# Altium footprint library NXP_60_26022015.PCBLIB: 287 footprints (part 1 of 18)
Each footprint in its own frame and in the unit in brackets; x right, y up, seen from the top. Pads: shape width x height; smd on the part's side, far side on the other; paste and mask are expansions set on the pad; w line width, h text height; cw(c..) or ccw(c..) is an arc to the next point about the centre after c.
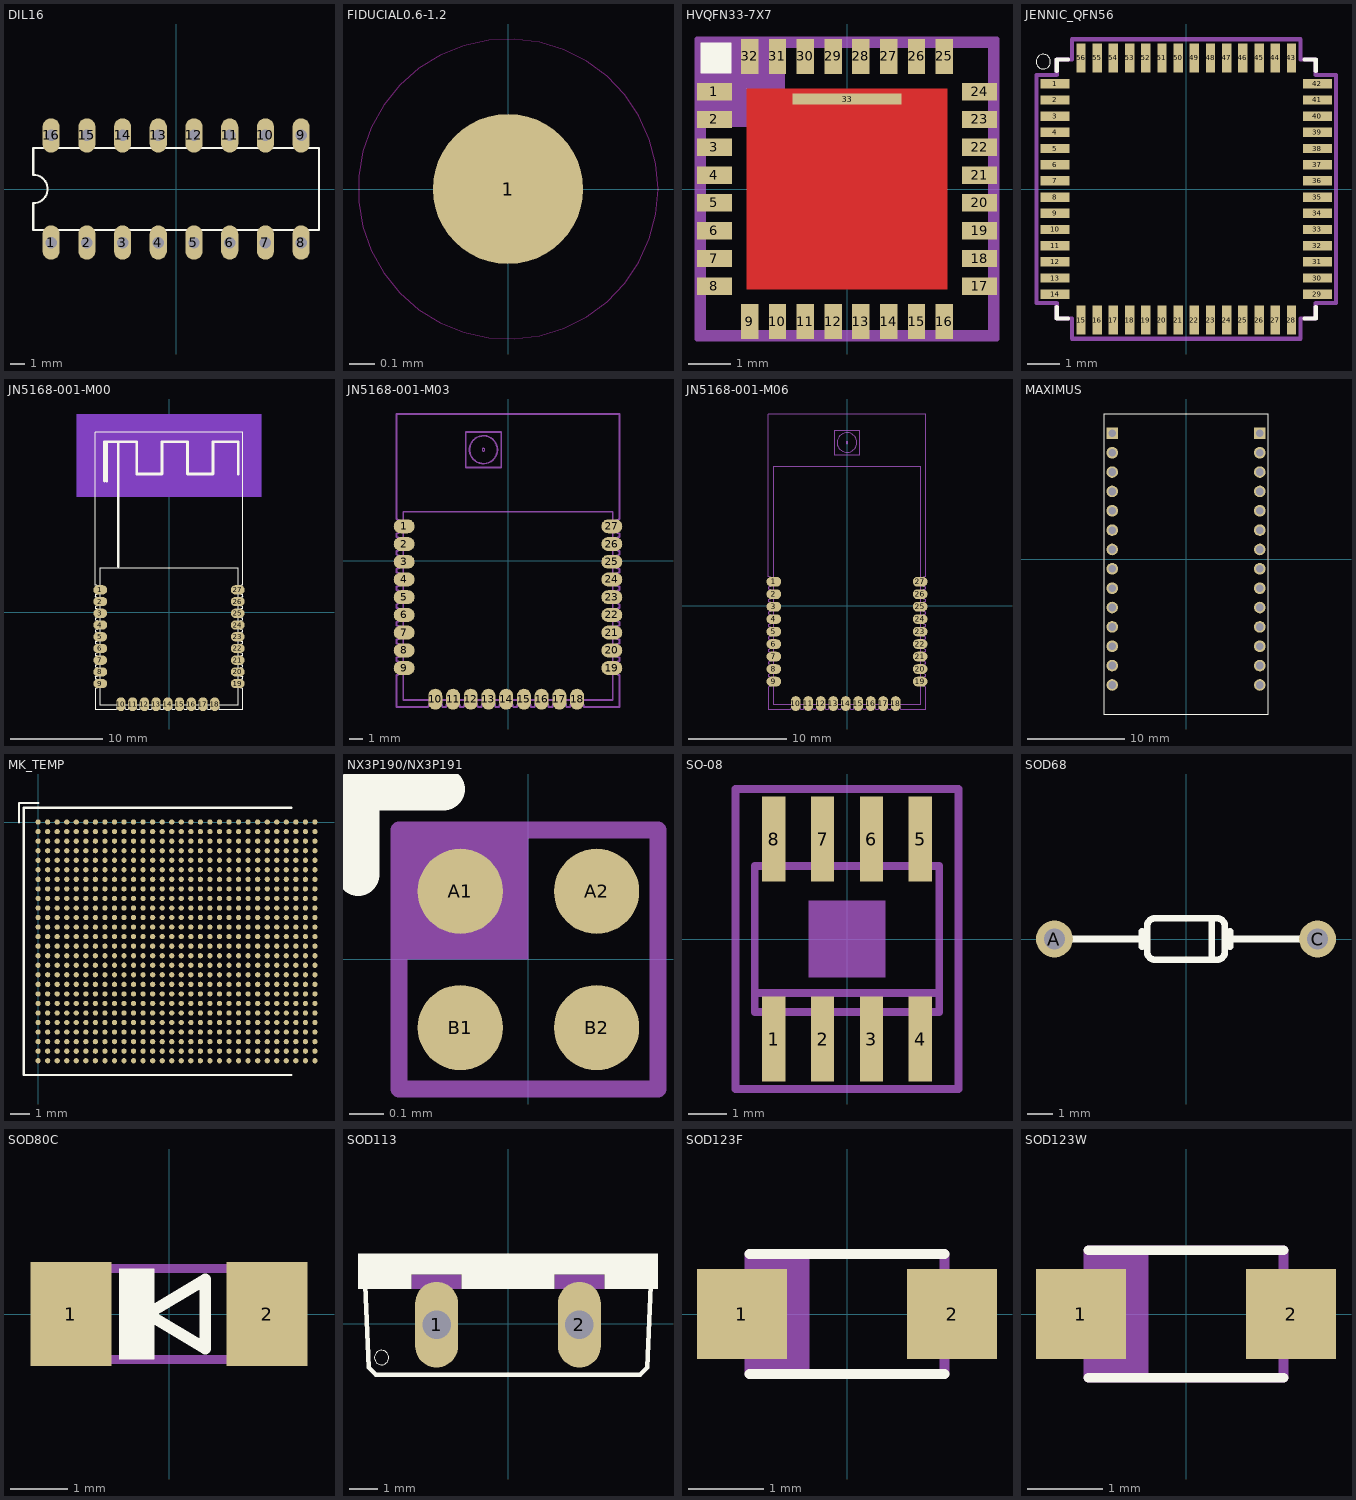
[diagram p0: the footprints below, top view; thin cyan lines are the x and y axes]

## DIL16 [mil]
pads (16):
  oval 48x96 hole 32: 1(-350,-150) 2(-250,-150) 3(-150,-150) 4(-50,-150) 5(50,-150) 6(150,-150) 7(250,-150) 8(350,-150) 9(350,150) 10(250,150) 11(150,150) 12(50,150) 13(-50,150) 14(-150,150) 15(-250,150) 16(-350,150)
Top Overlay:
  lines w6: -400,-115 400,-115 400,115 -400,115 -400,40 cw(c-400,0) -400,-40 -400,-115

## FIDUCIAL0.6-1.2 [mm]
pads (1):
  rrect100% 0.6x0.6 smd: 1(0,0)
Top Layer keep-out:
  circle w0: c0,0 r0.6
Top Solder:
  circle w0: c0,0 r0.6

## HVQFN33-7X7 [mil]
pads (33):
  rect 32x16 smd: 1(-122.05,89.57) 2(-122.05,63.98) 3(-122.05,38.39) 4(-122.05,12.8) 5(-122.05,-12.8) 6(-122.05,-38.39) 7(-122.05,-63.98) 8(-122.05,-89.57) 17(122.05,-89.57) 18(122.05,-63.98) 19(122.05,-38.39) 20(122.05,-12.8) 21(122.05,12.8) 22(122.05,38.39) 23(122.05,63.98) 24(122.05,89.57)
  rect 16x32 smd: 9(-89.57,-122.05) 10(-63.98,-122.05) 11(-38.39,-122.05) 12(-12.8,-122.05) 13(12.8,-122.05) 14(38.39,-122.05) 15(63.98,-122.05) 16(89.57,-122.05) 25(89.57,122.05) 26(63.98,122.05) 27(38.39,122.05) 28(12.8,122.05) 29(-12.8,122.05) 30(-38.39,122.05) 31(-63.98,122.05) 32(-89.57,122.05)
  rect 100x10 smd: 33(0,82.68)
Top Layer:
  rectangle: -92.52,-92.52 92.52,92.52
Top Overlay:
  rectangle: -135.04,106.3 -106.3,135.04
Top Paste:
  rectangle: -92.52,-92.52 92.52,92.52
Top Solder:
  rectangle: -92.52,-92.52 92.52,92.52
Mechanical 16:
  rectangle: -135.83,57.09 -57.09,135.83
  region: -118.11,83.66 -118.11,95.47 -137.8,95.47 -137.8,83.66
  region: -118.11,58.07 -118.11,69.88 -137.8,69.88 -137.8,58.07
  region: -118.11,32.48 -118.11,44.29 -137.8,44.29 -137.8,32.48
  region: -118.11,6.89 -118.11,18.7 -137.8,18.7 -137.8,6.89
  region: -118.11,-18.7 -118.11,-6.89 -137.8,-6.89 -137.8,-18.7
  region: -118.11,-44.29 -118.11,-32.48 -137.8,-32.48 -137.8,-44.29
  region: -118.11,-69.88 -118.11,-58.07 -137.8,-58.07 -137.8,-69.88
  region: -118.11,-95.47 -118.11,-83.66 -137.8,-83.66 -137.8,-95.47
  region: -83.66,-118.11 -95.47,-118.11 -95.47,-137.8 -83.66,-137.8
  region: -58.07,-118.11 -69.88,-118.11 -69.88,-137.8 -58.07,-137.8
  region: -32.48,-118.11 -44.29,-118.11 -44.29,-137.8 -32.48,-137.8
  region: -6.89,-118.11 -18.7,-118.11 -18.7,-137.8 -6.89,-137.8
  region: 18.7,-118.11 6.89,-118.11 6.89,-137.8 18.7,-137.8
  region: 44.29,-118.11 32.48,-118.11 32.48,-137.8 44.29,-137.8
  region: 69.88,-118.11 58.07,-118.11 58.07,-137.8 69.88,-137.8
  region: 95.47,-118.11 83.66,-118.11 83.66,-137.8 95.47,-137.8
  region: 118.11,-83.66 118.11,-95.47 137.8,-95.47 137.8,-83.66
  region: 118.11,-58.07 118.11,-69.88 137.8,-69.88 137.8,-58.07
  region: 118.11,-32.48 118.11,-44.29 137.8,-44.29 137.8,-32.48
  region: 118.11,-6.89 118.11,-18.7 137.8,-18.7 137.8,-6.89
  region: 118.11,18.7 118.11,6.89 137.8,6.89 137.8,18.7
  region: 118.11,44.29 118.11,32.48 137.8,32.48 137.8,44.29
  region: 118.11,69.88 118.11,58.07 137.8,58.07 137.8,69.88
  region: 118.11,95.47 118.11,83.66 137.8,83.66 137.8,95.47
  rectangle: 83.66,118.11 95.47,137.8
  rectangle: 58.07,118.11 69.88,137.8
  rectangle: 32.48,118.11 44.29,137.8
  rectangle: 6.89,118.11 18.7,137.8
  rectangle: -18.7,118.11 -6.89,137.8
  rectangle: -44.29,118.11 -32.48,137.8
  rectangle: -69.88,118.11 -58.07,137.8
  rectangle: -95.47,118.11 -83.66,137.8
  lines w5.91: -119.29,-92.72 ccw(c-119.29,-89.67) -119.29,-86.61 ; -119.29,-67.13 ccw(c-119.29,-64.08) -119.29,-61.02 ; -119.29,-41.54 ccw(c-119.29,-38.48) -119.29,-35.43 ; -119.29,-15.94 ccw(c-119.29,-12.89) -119.29,-9.84 ; -119.29,9.65 ccw(c-119.29,12.7) -119.29,15.75 ; -119.29,35.24 ccw(c-119.29,38.29) -119.29,41.34 ; -119.29,60.83 ccw(c-119.29,63.88) -119.29,66.93 ; -119.29,86.42 ccw(c-119.29,89.47) -119.29,92.52 ; -92.72,119.29 ccw(c-89.67,119.29) -86.61,119.29 ; -92.52,-119.29 cw(c-89.47,-119.29) -86.42,-119.29 ; -67.13,119.29 ccw(c-64.08,119.29) -61.02,119.29 ; -66.93,-119.29 cw(c-63.88,-119.29) -60.83,-119.29 ; -41.54,119.29 ccw(c-38.48,119.29) -35.43,119.29 ; -41.34,-119.29 cw(c-38.29,-119.29) -35.24,-119.29 ; -15.94,119.29 ccw(c-12.89,119.29) -9.84,119.29 ; -15.75,-119.29 cw(c-12.7,-119.29) -9.65,-119.29 ; 9.65,119.29 ccw(c12.7,119.29) 15.75,119.29 ; 9.84,-119.29 cw(c12.89,-119.29) 15.94,-119.29 ; 35.24,119.29 ccw(c38.29,119.29) 41.34,119.29 ; 35.43,-119.29 cw(c38.48,-119.29) 41.54,-119.29 ; 60.83,119.29 ccw(c63.88,119.29) 66.93,119.29 ; 61.02,-119.29 cw(c64.08,-119.29) 67.13,-119.29 ; 86.42,119.29 ccw(c89.47,119.29) 92.52,119.29 ; 86.61,-119.29 cw(c89.67,-119.29) 92.72,-119.29 ; 119.29,-92.52 cw(c119.29,-89.47) 119.29,-86.42 ; 119.29,-66.93 cw(c119.29,-63.88) 119.29,-60.83 ; 119.29,-41.34 cw(c119.29,-38.29) 119.29,-35.24 ; 119.29,-15.75 cw(c119.29,-12.7) 119.29,-9.65 ; 119.29,9.84 cw(c119.29,12.89) 119.29,15.94 ; 119.29,35.43 cw(c119.29,38.48) 119.29,41.54 ; 119.29,61.02 cw(c119.29,64.08) 119.29,67.13 ; 119.29,86.61 cw(c119.29,89.67) 119.29,92.72
  lines w8: -133.86,-133.86 133.86,-133.86 133.86,133.86 -133.86,133.86 -133.86,-133.86
Mechanical 27:
  lines w5: -137.8,-137.8 -137.8,137.8 137.8,137.8 137.8,-137.8 -137.8,-137.8

## JENNIC_QFN56 [mm]
pads (56):
  rect 0.9x0.29 smd: 1(-4.05,3.25) 2(-4.05,2.75) 3(-4.05,2.25) 4(-4.05,1.75) 5(-4.05,1.25) 6(-4.05,0.75) 7(-4.05,0.25) 8(-4.05,-0.25) 9(-4.05,-0.75) 10(-4.05,-1.25) 11(-4.05,-1.75) 12(-4.05,-2.25) 13(-4.05,-2.75) 14(-4.05,-3.25) 29(4.05,-3.25) 30(4.05,-2.75) 31(4.05,-2.25) 32(4.05,-1.75) 33(4.05,-1.25) 34(4.05,-0.75) 35(4.05,-0.25) 36(4.05,0.25) 37(4.05,0.75) 38(4.05,1.25) 39(4.05,1.75) 40(4.05,2.25) 41(4.05,2.75) 42(4.05,3.25)
  rect 0.29x0.9 smd: 15(-3.25,-4.05) 16(-2.75,-4.05) 17(-2.25,-4.05) 18(-1.75,-4.05) 19(-1.25,-4.05) 20(-0.75,-4.05) 21(-0.25,-4.05) 22(0.25,-4.05) 23(0.75,-4.05) 24(1.25,-4.05) 25(1.75,-4.05) 26(2.25,-4.05) 27(2.75,-4.05) 28(3.25,-4.05) 43(3.25,4.05) 44(2.75,4.05) 45(2.25,4.05) 46(1.75,4.05) 47(1.25,4.05) 48(0.75,4.05) 49(0.25,4.05) 50(-0.25,4.05) 51(-0.75,4.05) 52(-1.25,4.05) 53(-1.75,4.05) 54(-2.25,4.05) 55(-2.75,4.05) 56(-3.25,4.05)
Top Overlay:
  circle w0: c-4.418,3.935 r0.224
  lines w0.127: -4,-3.65 -4,-4 -3.65,-4 ; -4,3.65 -4,4 -3.65,4 ; 3.65,-4 4,-4 4,-3.65 ; 3.65,4 4,4 4,3.65
Mechanical 16:
  lines w0.127: -4.625,-3.525 -4.625,3.525 -4,3.525 -4,4 -3.525,4 -3.525,4.625 3.525,4.625 3.525,4 4,4 4,3.525 4.625,3.525 4.625,-3.525 4,-3.525 4,-4 3.525,-4 3.525,-4.625 -3.525,-4.625 -3.525,-4 -4,-4 -4,-3.525 -4.625,-3.525

## JN5168-001-M00 [mm]
pads (27):
  rrect100% 1.5x1 smd: 1(-7.44,2.45) 2(-7.44,1.18) 3(-7.44,-0.09) 4(-7.44,-1.36) 5(-7.44,-2.63) 6(-7.44,-3.9) 7(-7.44,-5.17) 8(-7.44,-6.44) 9(-7.44,-7.71) 19(7.44,-7.71) 20(7.44,-6.44) 21(7.44,-5.17) 22(7.44,-3.9) 23(7.44,-2.63) 24(7.44,-1.36) 25(7.44,-0.09) 26(7.44,1.18) 27(7.44,2.45)
  rrect100% 1x1.5 smd: 10(-5.21,-9.94) 11(-3.94,-9.94) 12(-2.67,-9.94) 13(-1.4,-9.94) 14(-0.13,-9.94) 15(1.14,-9.94) 16(2.41,-9.94) 17(3.68,-9.94) 18(4.95,-9.94)
Top Layer keep-out:
  rectangle: -10,12.5 10,21.5
Bottom Layer keep-out:
  rectangle: -10,12.5 10,21.5
Top Overlay:
  lines w0.127: -8,-10.5 -8,-8.21 ccw(c-8,-7.71) -8,-7.21 -8,-6.94 ccw(c-8,-6.44) -8,-5.94 -8,-5.67 ccw(c-8,-5.17) -8,-4.67 -8,-4.4 ccw(c-8,-3.9) -8,-3.4 -8,-3.13 ccw(c-8,-2.63) -8,-2.13 -8,-1.86 ccw(c-8,-1.36) -8,-0.86 -8,-0.59 ccw(c-8,-0.09) -8,0.41 -8,0.68 ccw(c-8,1.18) -8,1.68 -8,1.95 ccw(c-8,2.45) -8,2.95 -8,19.5 8,19.5 8,2.95 ccw(c8,2.45) 8,1.95 8,1.68 ccw(c8,1.18) 8,0.68 8,0.41 ccw(c8,-0.09) 8,-0.59 8,-0.86 ccw(c8,-1.36) 8,-1.86 8,-2.13 ccw(c8,-2.63) 8,-3.13 8,-3.4 ccw(c8,-3.9) 8,-4.4 8,-4.67 ccw(c8,-5.17) 8,-5.67 8,-5.94 ccw(c8,-6.44) 8,-6.94 8,-7.21 ccw(c8,-7.71) 8,-8.21 8,-10.5 5.45,-10.5 ccw(c4.95,-10.5) 4.45,-10.5 4.18,-10.5 ccw(c3.68,-10.5) 3.18,-10.5 2.91,-10.5 ccw(c2.41,-10.5) 1.91,-10.5 1.64,-10.5 ccw(c1.14,-10.5) 0.64,-10.5 0.37,-10.5 ccw(c-0.13,-10.5) -0.63,-10.5 -0.9,-10.5 ccw(c-1.4,-10.5) -1.9,-10.5 -2.17,-10.5 ccw(c-2.67,-10.5) -3.17,-10.5 -3.44,-10.5 ccw(c-3.94,-10.5) -4.44,-10.5 -4.71,-10.5 ccw(c-5.21,-10.5) -5.71,-10.5 -8,-10.5 ; -7.5,-10 -7.5,4.77 7.5,4.77 7.5,-10 -7.5,-10
  lines w0.305: -6.75,14.25 -6.75,18.5 ; -5.5,5 -5.5,18.5 ; 7.5,15 7.5,18.5 4.75,18.5 4.75,15 2,15 2,18.5 -0.75,18.5 -0.75,15 -3.5,15 -3.5,18.5 -5.5,18.5 ; -7,18.5 -6.75,18.5 ; -7,18.5 -7,14.25 -7,18.5 ; -6.75,18.5 -5.5,18.5

## JN5168-001-M03 [mm]
pads (27):
  rrect100% 1.5x1 smd: 1(-7.44,2.45) 2(-7.44,1.18) 3(-7.44,-0.09) 4(-7.44,-1.36) 5(-7.44,-2.63) 6(-7.44,-3.9) 7(-7.44,-5.17) 8(-7.44,-6.44) 9(-7.44,-7.71) 19(7.44,-7.71) 20(7.44,-6.44) 21(7.44,-5.17) 22(7.44,-3.9) 23(7.44,-2.63) 24(7.44,-1.36) 25(7.44,-0.09) 26(7.44,1.18) 27(7.44,2.45)
  rrect100% 1x1.5 smd: 10(-5.21,-9.94) 11(-3.94,-9.94) 12(-2.67,-9.94) 13(-1.4,-9.94) 14(-0.13,-9.94) 15(1.14,-9.94) 16(2.41,-9.94) 17(3.68,-9.94) 18(4.95,-9.94)
Mechanical 16:
  circle w0.127: c-1.76,7.94 r1
  circle w0: c-1.76,7.94 r0.1
  lines w0.127: -8,-10.5 -8,-8.21 ccw(c-8,-7.71) -8,-7.21 -8,-6.94 ccw(c-8,-6.44) -8,-5.94 -8,-5.67 ccw(c-8,-5.17) -8,-4.67 -8,-4.4 ccw(c-8,-3.9) -8,-3.4 -8,-3.13 ccw(c-8,-2.63) -8,-2.13 -8,-1.86 ccw(c-8,-1.36) -8,-0.86 -8,-0.59 ccw(c-8,-0.09) -8,0.41 -8,0.68 ccw(c-8,1.18) -8,1.68 -8,1.95 ccw(c-8,2.45) -8,2.95 -8,10.5 8,10.5 8,2.95 ccw(c8,2.45) 8,1.95 8,1.68 ccw(c8,1.18) 8,0.68 8,0.41 ccw(c8,-0.09) 8,-0.59 8,-0.86 ccw(c8,-1.36) 8,-1.86 8,-2.13 ccw(c8,-2.63) 8,-3.13 8,-3.4 ccw(c8,-3.9) 8,-4.4 8,-4.67 ccw(c8,-5.17) 8,-5.67 8,-5.94 ccw(c8,-6.44) 8,-6.94 8,-7.21 ccw(c8,-7.71) 8,-8.21 8,-10.5 5.45,-10.5 ccw(c4.95,-10.5) 4.45,-10.5 4.18,-10.5 ccw(c3.68,-10.5) 3.18,-10.5 2.91,-10.5 ccw(c2.41,-10.5) 1.91,-10.5 1.64,-10.5 ccw(c1.14,-10.5) 0.64,-10.5 0.37,-10.5 ccw(c-0.13,-10.5) -0.63,-10.5 -0.9,-10.5 ccw(c-1.4,-10.5) -1.9,-10.5 -2.17,-10.5 ccw(c-2.67,-10.5) -3.17,-10.5 -3.44,-10.5 ccw(c-3.94,-10.5) -4.44,-10.5 -4.71,-10.5 ccw(c-5.21,-10.5) -5.71,-10.5 -8,-10.5 ; -7.5,-10 -7.5,3.5 7.5,3.5 7.5,-10 -7.5,-10 ; -3.03,6.67 -0.49,6.67 -0.49,9.21 -3.03,9.21 -3.03,6.67

## JN5168-001-M06 [mm]
pads (27):
  rrect100% 1.5x1 smd: 1(-7.44,2.45) 2(-7.44,1.18) 3(-7.44,-0.09) 4(-7.44,-1.36) 5(-7.44,-2.63) 6(-7.44,-3.9) 7(-7.44,-5.17) 8(-7.44,-6.44) 9(-7.44,-7.71) 19(7.44,-7.71) 20(7.44,-6.44) 21(7.44,-5.17) 22(7.44,-3.9) 23(7.44,-2.63) 24(7.44,-1.36) 25(7.44,-0.09) 26(7.44,1.18) 27(7.44,2.45)
  rrect100% 1x1.5 smd: 10(-5.21,-9.94) 11(-3.94,-9.94) 12(-2.67,-9.94) 13(-1.4,-9.94) 14(-0.13,-9.94) 15(1.14,-9.94) 16(2.41,-9.94) 17(3.68,-9.94) 18(4.95,-9.94)
Mechanical 16:
  circle w0.127: c0,16.6 r1
  circle w0: c0,16.6 r0.1
  lines w0.127: -8,-10.5 -8,-8.21 ccw(c-8,-7.71) -8,-7.21 -8,-6.94 ccw(c-8,-6.44) -8,-5.94 -8,-5.67 ccw(c-8,-5.17) -8,-4.67 -8,-4.4 ccw(c-8,-3.9) -8,-3.4 -8,-3.13 ccw(c-8,-2.63) -8,-2.13 -8,-1.86 ccw(c-8,-1.36) -8,-0.86 -8,-0.59 ccw(c-8,-0.09) -8,0.41 -8,0.68 ccw(c-8,1.18) -8,1.68 -8,1.95 ccw(c-8,2.45) -8,2.95 -8,19.5 8,19.5 8,2.95 ccw(c8,2.45) 8,1.95 8,1.68 ccw(c8,1.18) 8,0.68 8,0.41 ccw(c8,-0.09) 8,-0.59 8,-0.86 ccw(c8,-1.36) 8,-1.86 8,-2.13 ccw(c8,-2.63) 8,-3.13 8,-3.4 ccw(c8,-3.9) 8,-4.4 8,-4.67 ccw(c8,-5.17) 8,-5.67 8,-5.94 ccw(c8,-6.44) 8,-6.94 8,-7.21 ccw(c8,-7.71) 8,-8.21 8,-10.5 5.45,-10.5 ccw(c4.95,-10.5) 4.45,-10.5 4.18,-10.5 ccw(c3.68,-10.5) 3.18,-10.5 2.91,-10.5 ccw(c2.41,-10.5) 1.91,-10.5 1.64,-10.5 ccw(c1.14,-10.5) 0.64,-10.5 0.37,-10.5 ccw(c-0.13,-10.5) -0.63,-10.5 -0.9,-10.5 ccw(c-1.4,-10.5) -1.9,-10.5 -2.17,-10.5 ccw(c-2.67,-10.5) -3.17,-10.5 -3.44,-10.5 ccw(c-3.94,-10.5) -4.44,-10.5 -4.71,-10.5 ccw(c-5.21,-10.5) -5.71,-10.5 -8,-10.5 ; -7.5,-10 -7.5,14.16 7.5,14.16 7.5,-10 -7.5,-10 ; -1.27,15.33 1.27,15.33 1.27,17.87 -1.27,17.87 -1.27,15.33

## MAXIMUS [mil]
pads (28):
  rect 47.25x47.25 hole 31.5: X1_1(-300.2,511.81) X2_1(300.2,511.81)
  round 47.25 hole 31.5: X1_2(-300.2,433.07) X1_3(-300.2,354.33) X1_4(-300.2,275.59) X1_5(-300.2,196.85) X1_6(-300.2,118.11) X1_7(-300.2,39.37) X1_8(-300.2,-39.37) X1_9(-300.2,-118.11) X1_10(-300.2,-196.85) X1_11(-300.2,-275.59) X1_12(-300.2,-354.33) X1_13(-300.2,-433.07) X1_14(-300.2,-511.81) X2_2(300.2,433.07) X2_3(300.2,354.33) X2_4(300.2,275.59) X2_5(300.2,196.85) X2_6(300.2,118.11) X2_7(300.2,39.37) X2_8(300.2,-39.37) X2_9(300.2,-118.11) X2_10(300.2,-196.85) X2_11(300.2,-275.59) X2_12(300.2,-354.33) X2_13(300.2,-433.07) X2_14(300.2,-511.81)
Top Overlay:
  lines w5: -334.65,-629.92 -334.65,590.55 334.65,590.55 334.65,-629.92 -334.65,-629.92

## MK_TEMP [mm]
pads (780):
  rrect100% 0.275x0.275 smd: A1(0,0) A2(0.5,0) A3(1,0) A4(1.5,0) A5(2,0) A6(2.5,0) A7(3,0) A8(3.5,0) A9(4,0) A10(4.5,0) A11(5,0) A12(5.5,0) A13(6,0) A14(6.5,0) A15(7,0) A16(7.5,0) A17(8,0) A18(8.5,0) A19(9,0) A20(9.5,0) A21(10,0) A22(10.5,0) A23(11,0) A24(11.5,0) A25(12,0) A26(12.5,0) A27(13,0) A28(13.5,0) A29(14,0) A30(14.5,0) AA1(0,-10) AA2(0.5,-10) AA3(1,-10) AA4(1.5,-10) AA5(2,-10) AA6(2.5,-10) AA7(3,-10) AA8(3.5,-10) AA9(4,-10) AA10(4.5,-10) AA11(5,-10) AA12(5.5,-10) AA13(6,-10) AA14(6.5,-10) AA15(7,-10) AA16(7.5,-10) AA17(8,-10) AA18(8.5,-10) AA19(9,-10) AA20(9.5,-10) AA21(10,-10) AA22(10.5,-10) AA23(11,-10) AA24(11.5,-10) AA25(12,-10) AA26(12.5,-10) AA27(13,-10) AA28(13.5,-10) AA29(14,-10) AA30(14.5,-10) AB1(0,-10.5) AB2(0.5,-10.5) AB3(1,-10.5) AB4(1.5,-10.5) AB5(2,-10.5) AB6(2.5,-10.5) AB7(3,-10.5) AB8(3.5,-10.5) AB9(4,-10.5) AB10(4.5,-10.5) AB11(5,-10.5) AB12(5.5,-10.5) AB13(6,-10.5) AB14(6.5,-10.5) AB15(7,-10.5) AB16(7.5,-10.5) AB17(8,-10.5) AB18(8.5,-10.5) AB19(9,-10.5) AB20(9.5,-10.5) AB21(10,-10.5) AB22(10.5,-10.5) AB23(11,-10.5) AB24(11.5,-10.5) AB25(12,-10.5) AB26(12.5,-10.5) AB27(13,-10.5) AB28(13.5,-10.5) AB29(14,-10.5) AB30(14.5,-10.5) AC1(0,-11) AC2(0.5,-11) AC3(1,-11) AC4(1.5,-11) AC5(2,-11) AC6(2.5,-11) AC7(3,-11) AC8(3.5,-11) AC9(4,-11) AC10(4.5,-11) AC11(5,-11) AC12(5.5,-11) AC13(6,-11) AC14(6.5,-11) AC15(7,-11) AC16(7.5,-11) AC17(8,-11) AC18(8.5,-11) AC19(9,-11) AC20(9.5,-11) AC21(10,-11) AC22(10.5,-11) AC23(11,-11) AC24(11.5,-11) AC25(12,-11) AC26(12.5,-11) AC27(13,-11) AC28(13.5,-11) AC29(14,-11) AC30(14.5,-11) AD1(0,-11.5) AD2(0.5,-11.5) AD3(1,-11.5) AD4(1.5,-11.5) AD5(2,-11.5) AD6(2.5,-11.5) AD7(3,-11.5) AD8(3.5,-11.5) AD9(4,-11.5) AD10(4.5,-11.5) AD11(5,-11.5) AD12(5.5,-11.5) AD13(6,-11.5) AD14(6.5,-11.5) AD15(7,-11.5) AD16(7.5,-11.5) AD17(8,-11.5) AD18(8.5,-11.5) AD19(9,-11.5) AD20(9.5,-11.5) AD21(10,-11.5) AD22(10.5,-11.5) AD23(11,-11.5) AD24(11.5,-11.5) AD25(12,-11.5) AD26(12.5,-11.5) AD27(13,-11.5) AD28(13.5,-11.5) AD29(14,-11.5) AD30(14.5,-11.5) AE1(0,-12) AE2(0.5,-12) AE3(1,-12) AE4(1.5,-12) AE5(2,-12) AE6(2.5,-12) AE7(3,-12) AE8(3.5,-12) AE9(4,-12) AE10(4.5,-12) AE11(5,-12) AE12(5.5,-12) AE13(6,-12) AE14(6.5,-12) AE15(7,-12) AE16(7.5,-12) AE17(8,-12) AE18(8.5,-12) AE19(9,-12) AE20(9.5,-12) AE21(10,-12) AE22(10.5,-12) AE23(11,-12) AE24(11.5,-12) AE25(12,-12) AE26(12.5,-12) AE27(13,-12) AE28(13.5,-12) AE29(14,-12) AE30(14.5,-12) AF1(0,-12.5) AF2(0.5,-12.5) AF3(1,-12.5) AF4(1.5,-12.5) AF5(2,-12.5) AF6(2.5,-12.5) AF7(3,-12.5) AF8(3.5,-12.5) AF9(4,-12.5) AF10(4.5,-12.5) AF11(5,-12.5) AF12(5.5,-12.5) AF13(6,-12.5) AF14(6.5,-12.5) AF15(7,-12.5) AF16(7.5,-12.5) AF17(8,-12.5) AF18(8.5,-12.5) AF19(9,-12.5) AF20(9.5,-12.5) AF21(10,-12.5) AF22(10.5,-12.5) AF23(11,-12.5) AF24(11.5,-12.5) AF25(12,-12.5) AF26(12.5,-12.5) AF27(13,-12.5) AF28(13.5,-12.5) AF29(14,-12.5) AF30(14.5,-12.5) B1(0,-0.5) B2(0.5,-0.5) B3(1,-0.5) B4(1.5,-0.5) B5(2,-0.5) B6(2.5,-0.5) B7(3,-0.5) B8(3.5,-0.5) B9(4,-0.5) B10(4.5,-0.5) B11(5,-0.5) B12(5.5,-0.5) B13(6,-0.5) B14(6.5,-0.5) B15(7,-0.5) B16(7.5,-0.5) B17(8,-0.5) B18(8.5,-0.5) B19(9,-0.5) B20(9.5,-0.5) B21(10,-0.5) B22(10.5,-0.5) B23(11,-0.5) B24(11.5,-0.5) B25(12,-0.5) B26(12.5,-0.5) B27(13,-0.5) B28(13.5,-0.5) B29(14,-0.5) B30(14.5,-0.5) C1(0,-1) C2(0.5,-1) C3(1,-1) C4(1.5,-1) C5(2,-1) C6(2.5,-1) C7(3,-1) C8(3.5,-1) C9(4,-1) C10(4.5,-1) C11(5,-1) C12(5.5,-1) C13(6,-1) C14(6.5,-1) C15(7,-1) C16(7.5,-1) C17(8,-1) C18(8.5,-1) C19(9,-1) C20(9.5,-1) C21(10,-1) C22(10.5,-1) C23(11,-1) C24(11.5,-1) C25(12,-1) C26(12.5,-1) C27(13,-1) C28(13.5,-1) C29(14,-1) C30(14.5,-1) D1(0,-1.5) D2(0.5,-1.5) D3(1,-1.5) D4(1.5,-1.5) D5(2,-1.5) D6(2.5,-1.5) D7(3,-1.5) D8(3.5,-1.5) D9(4,-1.5) D10(4.5,-1.5) D11(5,-1.5) D12(5.5,-1.5) D13(6,-1.5) D14(6.5,-1.5) D15(7,-1.5) D16(7.5,-1.5) D17(8,-1.5) D18(8.5,-1.5) D19(9,-1.5) D20(9.5,-1.5) D21(10,-1.5) D22(10.5,-1.5) D23(11,-1.5) D24(11.5,-1.5) D25(12,-1.5) D26(12.5,-1.5) D27(13,-1.5) D28(13.5,-1.5) D29(14,-1.5) D30(14.5,-1.5) E1(0,-2) E2(0.5,-2) E3(1,-2) E4(1.5,-2) E5(2,-2) E6(2.5,-2) E7(3,-2) E8(3.5,-2) E9(4,-2) E10(4.5,-2) E11(5,-2) E12(5.5,-2) E13(6,-2) E14(6.5,-2) E15(7,-2) E16(7.5,-2) E17(8,-2) E18(8.5,-2) E19(9,-2) E20(9.5,-2) E21(10,-2) E22(10.5,-2) E23(11,-2) E24(11.5,-2) E25(12,-2) E26(12.5,-2) E27(13,-2) E28(13.5,-2) E29(14,-2) E30(14.5,-2) F1(0,-2.5) F2(0.5,-2.5) F3(1,-2.5) F4(1.5,-2.5) F5(2,-2.5) F6(2.5,-2.5) F7(3,-2.5) F8(3.5,-2.5) F9(4,-2.5) F10(4.5,-2.5) F11(5,-2.5) F12(5.5,-2.5) F13(6,-2.5) F14(6.5,-2.5) F15(7,-2.5) F16(7.5,-2.5) F17(8,-2.5) F18(8.5,-2.5) F19(9,-2.5) F20(9.5,-2.5) F21(10,-2.5) F22(10.5,-2.5) F23(11,-2.5) F24(11.5,-2.5) F25(12,-2.5) F26(12.5,-2.5) F27(13,-2.5) F28(13.5,-2.5) F29(14,-2.5) F30(14.5,-2.5) G1(0,-3) G2(0.5,-3) G3(1,-3) G4(1.5,-3) G5(2,-3) G6(2.5,-3) G7(3,-3) G8(3.5,-3) G9(4,-3) G10(4.5,-3) G11(5,-3) G12(5.5,-3) G13(6,-3) G14(6.5,-3) G15(7,-3) G16(7.5,-3) G17(8,-3) G18(8.5,-3) G19(9,-3) G20(9.5,-3) G21(10,-3) G22(10.5,-3) G23(11,-3) G24(11.5,-3) G25(12,-3) G26(12.5,-3) G27(13,-3) G28(13.5,-3) G29(14,-3) G30(14.5,-3) H1(0,-3.5) H2(0.5,-3.5) H3(1,-3.5) H4(1.5,-3.5) H5(2,-3.5) H6(2.5,-3.5) H7(3,-3.5) H8(3.5,-3.5) H9(4,-3.5) H10(4.5,-3.5) H11(5,-3.5) H12(5.5,-3.5) H13(6,-3.5) H14(6.5,-3.5) H15(7,-3.5) H16(7.5,-3.5) H17(8,-3.5) H18(8.5,-3.5) H19(9,-3.5) H20(9.5,-3.5) H21(10,-3.5) H22(10.5,-3.5) H23(11,-3.5) H24(11.5,-3.5) H25(12,-3.5) H26(12.5,-3.5) H27(13,-3.5) H28(13.5,-3.5) H29(14,-3.5) H30(14.5,-3.5) J1(0,-4) J2(0.5,-4) J3(1,-4) J4(1.5,-4) J5(2,-4) J6(2.5,-4) J7(3,-4) J8(3.5,-4) J9(4,-4) J10(4.5,-4) J11(5,-4) J12(5.5,-4) J13(6,-4) J14(6.5,-4) J15(7,-4) J16(7.5,-4) J17(8,-4) J18(8.5,-4) J19(9,-4) J20(9.5,-4) J21(10,-4) J22(10.5,-4) J23(11,-4) J24(11.5,-4) J25(12,-4) J26(12.5,-4) J27(13,-4) J28(13.5,-4) J29(14,-4) J30(14.5,-4) K1(0,-4.5) K2(0.5,-4.5) K3(1,-4.5) K4(1.5,-4.5) K5(2,-4.5) K6(2.5,-4.5) K7(3,-4.5) K8(3.5,-4.5) K9(4,-4.5) K10(4.5,-4.5) K11(5,-4.5) K12(5.5,-4.5) K13(6,-4.5) K14(6.5,-4.5) K15(7,-4.5) K16(7.5,-4.5) K17(8,-4.5) K18(8.5,-4.5) K19(9,-4.5) K20(9.5,-4.5) K21(10,-4.5) K22(10.5,-4.5) K23(11,-4.5) K24(11.5,-4.5) K25(12,-4.5) K26(12.5,-4.5) K27(13,-4.5) K28(13.5,-4.5) K29(14,-4.5) K30(14.5,-4.5) L1(0,-5) L2(0.5,-5) L3(1,-5) L4(1.5,-5) L5(2,-5) L6(2.5,-5) L7(3,-5) L8(3.5,-5) L9(4,-5) L10(4.5,-5) L11(5,-5) L12(5.5,-5) L13(6,-5) L14(6.5,-5) L15(7,-5) L16(7.5,-5) L17(8,-5) L18(8.5,-5) L19(9,-5) L20(9.5,-5) L21(10,-5) L22(10.5,-5) L23(11,-5) L24(11.5,-5) L25(12,-5) L26(12.5,-5) L27(13,-5) L28(13.5,-5) L29(14,-5) L30(14.5,-5) M1(0,-5.5) M2(0.5,-5.5) M3(1,-5.5) M4(1.5,-5.5) M5(2,-5.5) M6(2.5,-5.5) M7(3,-5.5) M8(3.5,-5.5) M9(4,-5.5) M10(4.5,-5.5) M11(5,-5.5) M12(5.5,-5.5) M13(6,-5.5) M14(6.5,-5.5) M15(7,-5.5) M16(7.5,-5.5) M17(8,-5.5) M18(8.5,-5.5) M19(9,-5.5) M20(9.5,-5.5) M21(10,-5.5) M22(10.5,-5.5) M23(11,-5.5) M24(11.5,-5.5) M25(12,-5.5) M26(12.5,-5.5) M27(13,-5.5) M28(13.5,-5.5) M29(14,-5.5) M30(14.5,-5.5) N1(0,-6) N2(0.5,-6) N3(1,-6) N4(1.5,-6) N5(2,-6) N6(2.5,-6) N7(3,-6) N8(3.5,-6) N9(4,-6) N10(4.5,-6) N11(5,-6) N12(5.5,-6) N13(6,-6) N14(6.5,-6) N15(7,-6) N16(7.5,-6) N17(8,-6) N18(8.5,-6) N19(9,-6) N20(9.5,-6) N21(10,-6) N22(10.5,-6) N23(11,-6) N24(11.5,-6) N25(12,-6) N26(12.5,-6) N27(13,-6) N28(13.5,-6) N29(14,-6) N30(14.5,-6) P1(0,-6.5) P2(0.5,-6.5) P3(1,-6.5) P4(1.5,-6.5) P5(2,-6.5) P6(2.5,-6.5) P7(3,-6.5) P8(3.5,-6.5) P9(4,-6.5) P10(4.5,-6.5) P11(5,-6.5) P12(5.5,-6.5) P13(6,-6.5) P14(6.5,-6.5) P15(7,-6.5) P16(7.5,-6.5) P17(8,-6.5) P18(8.5,-6.5) P19(9,-6.5) P20(9.5,-6.5) P21(10,-6.5) P22(10.5,-6.5) P23(11,-6.5) P24(11.5,-6.5) P25(12,-6.5) P26(12.5,-6.5) P27(13,-6.5) P28(13.5,-6.5) P29(14,-6.5) P30(14.5,-6.5) R1(0,-7) R2(0.5,-7) R3(1,-7) R4(1.5,-7) R5(2,-7) R6(2.5,-7) R7(3,-7) R8(3.5,-7) R9(4,-7) R10(4.5,-7) R11(5,-7) R12(5.5,-7) R13(6,-7) R14(6.5,-7) R15(7,-7) R16(7.5,-7) R17(8,-7) R18(8.5,-7) R19(9,-7) R20(9.5,-7) R21(10,-7) R22(10.5,-7) R23(11,-7) R24(11.5,-7) R25(12,-7) R26(12.5,-7) R27(13,-7) R28(13.5,-7) R29(14,-7) R30(14.5,-7) T1(0,-7.5) T2(0.5,-7.5) T3(1,-7.5) T4(1.5,-7.5) T5(2,-7.5) T6(2.5,-7.5) T7(3,-7.5) T8(3.5,-7.5) T9(4,-7.5) T10(4.5,-7.5) T11(5,-7.5) T12(5.5,-7.5) T13(6,-7.5) T14(6.5,-7.5) T15(7,-7.5) T16(7.5,-7.5) T17(8,-7.5) T18(8.5,-7.5) T19(9,-7.5) T20(9.5,-7.5) T21(10,-7.5) T22(10.5,-7.5) T23(11,-7.5) T24(11.5,-7.5) T25(12,-7.5) T26(12.5,-7.5) T27(13,-7.5) T28(13.5,-7.5) T29(14,-7.5) T30(14.5,-7.5) U1(0,-8) U2(0.5,-8) U3(1,-8) U4(1.5,-8) U5(2,-8) U6(2.5,-8) U7(3,-8) U8(3.5,-8) U9(4,-8) U10(4.5,-8) U11(5,-8) U12(5.5,-8) U13(6,-8) U14(6.5,-8) U15(7,-8) U16(7.5,-8) U17(8,-8) U18(8.5,-8) U19(9,-8) U20(9.5,-8) U21(10,-8) U22(10.5,-8) U23(11,-8) U24(11.5,-8) U25(12,-8) U26(12.5,-8) U27(13,-8) U28(13.5,-8) U29(14,-8) U30(14.5,-8) V1(0,-8.5) V2(0.5,-8.5) V3(1,-8.5) V4(1.5,-8.5) V5(2,-8.5) V6(2.5,-8.5) V7(3,-8.5) V8(3.5,-8.5) V9(4,-8.5) V10(4.5,-8.5) V11(5,-8.5) V12(5.5,-8.5) V13(6,-8.5) V14(6.5,-8.5) V15(7,-8.5) V16(7.5,-8.5) V17(8,-8.5) V18(8.5,-8.5) V19(9,-8.5) V20(9.5,-8.5) V21(10,-8.5) V22(10.5,-8.5) V23(11,-8.5) V24(11.5,-8.5) V25(12,-8.5) V26(12.5,-8.5) V27(13,-8.5) V28(13.5,-8.5) V29(14,-8.5) V30(14.5,-8.5) W1(0,-9) W2(0.5,-9) W3(1,-9) W4(1.5,-9) W5(2,-9) W6(2.5,-9) W7(3,-9) W8(3.5,-9) W9(4,-9) W10(4.5,-9) W11(5,-9) W12(5.5,-9) W13(6,-9) W14(6.5,-9) W15(7,-9) W16(7.5,-9) W17(8,-9) W18(8.5,-9) W19(9,-9) W20(9.5,-9) W21(10,-9) W22(10.5,-9) W23(11,-9) W24(11.5,-9) W25(12,-9) W26(12.5,-9) W27(13,-9) W28(13.5,-9) W29(14,-9) W30(14.5,-9) Y1(0,-9.5) Y2(0.5,-9.5) Y3(1,-9.5) Y4(1.5,-9.5) Y5(2,-9.5) Y6(2.5,-9.5) Y7(3,-9.5) Y8(3.5,-9.5) Y9(4,-9.5) Y10(4.5,-9.5) Y11(5,-9.5) Y12(5.5,-9.5) Y13(6,-9.5) Y14(6.5,-9.5) Y15(7,-9.5) Y16(7.5,-9.5) Y17(8,-9.5) Y18(8.5,-9.5) Y19(9,-9.5) Y20(9.5,-9.5) Y21(10,-9.5) Y22(10.5,-9.5) Y23(11,-9.5) Y24(11.5,-9.5) Y25(12,-9.5) Y26(12.5,-9.5) Y27(13,-9.5) Y28(13.5,-9.5) Y29(14,-9.5) Y30(14.5,-9.5)
Top Overlay:
  lines w0.127: -1,0 -1,1 0,1 ; 13.25,-13.25 -0.75,-13.25 -0.75,0.75 13.25,0.75
Top Paste:
  drawing of 780 lines, arcs and shapes, not listed
Top Solder:
  drawing of 780 lines, arcs and shapes, not listed

## NX3P190/NX3P191 [mm]
pads (4):
  rrect100% 0.25x0.25 smd: A1(-0.2,0.2) A2(0.2,0.2) B1(-0.2,-0.2) B2(0.2,-0.2)
Top Overlay:
  lines w0.127: -0.5,0.25 -0.5,0.5 -0.25,0.5
Top Solder:
  circle w0: c0.2,0.2 r0.163
  circle w0: c-0.2,0.2 r0.163
  circle w0: c-0.2,-0.2 r0.163
  circle w0: c0.2,-0.2 r0.163
Mechanical 16:
  rectangle: -0.38,0 0,0.38
  lines w0.05: -0.38,-0.38 0.38,-0.38 0.38,0.38 -0.38,0.38 -0.38,-0.38

## SO-08 [mm]
pads (8):
  rect 0.6x2.2 smd: 1(-1.905,-2.6) 2(-0.635,-2.6) 3(0.635,-2.6) 4(1.905,-2.6) 5(1.905,2.6) 6(0.635,2.6) 7(-0.635,2.6) 8(-1.905,2.6)
Mechanical 6:
  rectangle: -1,-1 1,1
Mechanical 13:
  text "IPC SO8" at -1.905,-0.635 h0.63
  text "JEDEC MS-012 AA" at -1.905,0.365 h0.47
Mechanical 16:
  rectangle: -2.15,-3.1 -1.66,-2
  rectangle: -0.88,-3.1 -0.39,-2
  rectangle: 0.39,-3.1 0.88,-2
  rectangle: 1.66,-3.1 2.15,-2
  rectangle: 1.66,2 2.15,3.1
  rectangle: 0.39,2 0.88,3.1
  rectangle: -0.88,2 -0.39,3.1
  rectangle: -2.15,2 -1.66,3.1
  lines w0.203: -2.4,-1.4 -2.4,-1.9 2.4,-1.9 2.4,-1.4 ; -2.4,-1.4 -2.4,1.9 2.4,1.9 2.4,-1.4 ; -2.4,-1.4 2.4,-1.4
Mechanical 27:
  lines w0.2: -2.9,-3.9 2.9,-3.9 2.9,3.9 -2.9,3.9 -2.9,-3.9

## SOD68 [mil]
pads (2):
  round 56 hole 31.5: A(-200,0) C(200,0)
Top Overlay:
  lines w10: -200,0 -62.99,0 ; -66.93,-11.81 -66.93,11.81 ; 66.93,-11.81 66.93,11.81 ; 200,0 59.06,0 ; 39.37,-31.5 47.24,-31.5 ccw(c47.24,-19.68) 59.06,-19.69 59.06,0 ; 39.37,-31.5 -47.24,-31.5 cw(c-47.24,-19.68) -59.06,-19.69 -59.06,19.69 cw(c-47.24,19.68) -47.24,31.5 39.37,31.5 ; 39.37,-31.5 39.37,31.5 ; 39.37,31.5 47.24,31.5 cw(c47.24,19.68) 59.06,19.69 59.06,0

## SOD80C [mm]
pads (2):
  rect 1.4x1.8 smd: 1(-1.7,0) 2(1.7,0)
Top Overlay:
  rectangle: -0.864,-0.787 -0.254,0.787
  lines w0.203: -0.373,0 0.627,0.6 0.627,-0.6 -0.373,0
Mechanical 16:
  rectangle: -1.854,-0.864 -1.295,0.864
  rectangle: 1.295,-0.864 1.854,0.864
  lines w0.152: -1.321,-0.787 1.321,-0.787 ; -1.321,0.787 1.321,0.787

## SOD113 [mil]
pads (2):
  oval 60x120 hole 40: 1(-100,-1.57) 2(100,-1.57)
Top Overlay:
  circle w0: c-177,-47.57 r10
  rectangle: -210,68.43 210,98.43
  rectangle: -210,48.43 -135,68.43
  rectangle: -65,48.43 65,68.43
  rectangle: 135,48.43 210,68.43
  lines w6: -200,53.43 -195,-61.57 -185,-71.57 185,-71.57 195,-61.57 200,53.43
Mechanical 16:
  rectangle: -135,48.43 -65,68.43
  rectangle: 65,48.43 135,68.43

## SOD123F [mm]
pads (2):
  rect 1.2x1.2 smd: 1(-1.4,0) 2(1.4,0)
Top Overlay:
  lines w0.127: -1.3,-0.8 1.3,-0.8 ; -1.3,0.8 1.3,0.8
Top Paste:
  rectangle: -1.95,-0.55 -0.85,0.55
  rectangle: 0.85,-0.55 1.95,0.55
Mechanical 16:
  rectangle: 1.3,-0.3 1.75,0.3
  region: -1.3,0.3 -1.75,0.3 -1.75,-0.3 -1.3,-0.3
  rectangle: -1.3,-0.8 -0.5,0.8
  lines w0.127: -1.3,-0.8 1.3,-0.8 1.3,0.8 -1.3,0.8 -1.3,-0.8

## SOD123W [mm]
pads (2):
  rect 1.2x1.2 smd: 1(-1.4,0) 2(1.4,0)
Top Overlay:
  lines w0.127: -1.3,-0.85 1.3,-0.85 ; -1.3,0.85 1.3,0.85
Top Paste:
  rectangle: -1.95,-0.55 -0.85,0.55
  rectangle: 0.85,-0.55 1.95,0.55
Mechanical 16:
  rectangle: 1.3,-0.3 1.75,0.3
  region: -1.3,0.3 -1.75,0.3 -1.75,-0.3 -1.3,-0.3
  rectangle: -1.3,-0.8 -0.5,0.8
  lines w0.127: -1.3,-0.85 1.3,-0.85 1.3,0.85 -1.3,0.85 -1.3,-0.85